# Altium footprint library Connector_art.PcbLib: 209 footprints (part 8 of 14)
Each footprint in its own frame and in the unit in brackets; x right, y up, seen from the top. Pads: shape width x height; smd on the part's side, far side on the other; paste and mask are expansions set on the pad; w line width, h text height; cw(c..) or ccw(c..) is an arc to the next point about the centre after c.
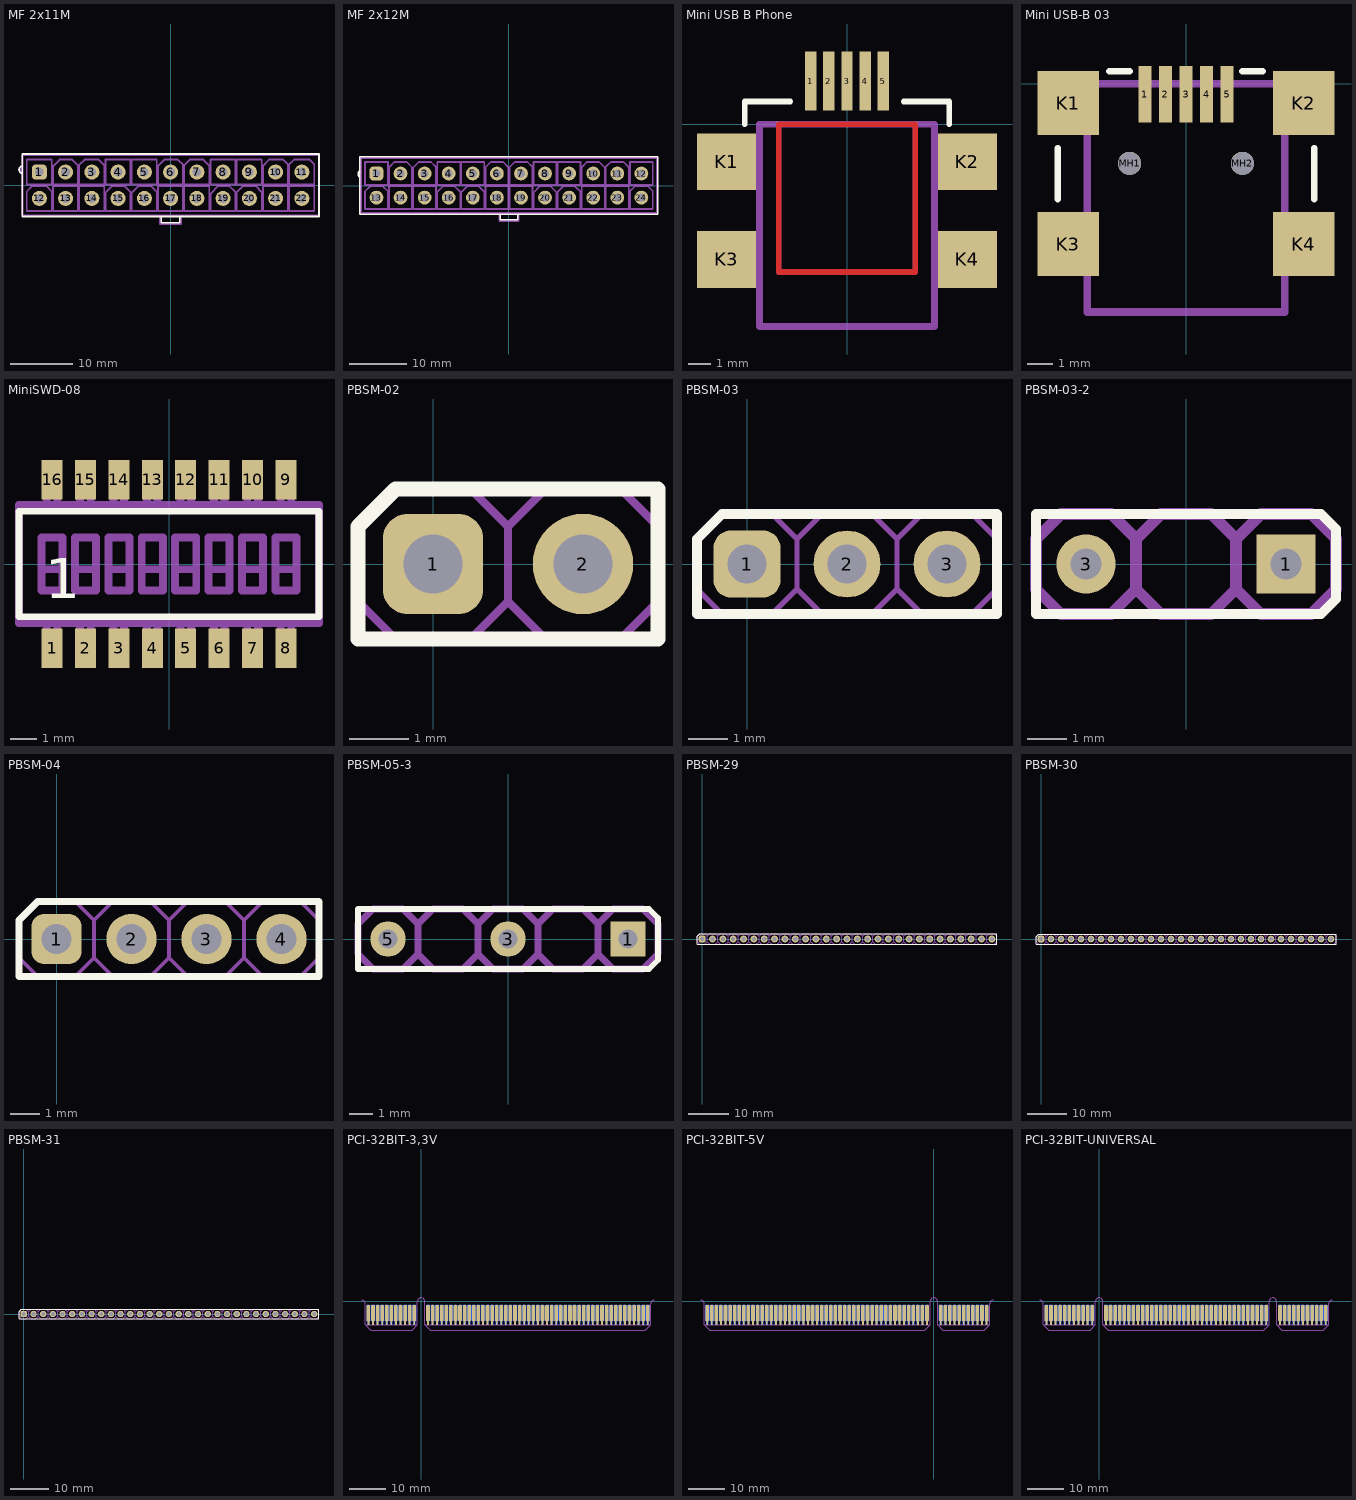
[diagram p7: the footprints below, top view; thin cyan lines are the x and y axes]

## MF 2x11M [mm]
height 12.8
pads (22):
  rrect50% 2.4x2.4 hole 1.4 paste+0: 1(-21,2.1)
  round 2.4 hole 1.4: 2(-16.8,2.1) 3(-12.6,2.1) 4(-8.4,2.1) 5(-4.2,2.1) 6(0,2.1) 7(4.2,2.1) 8(8.4,2.1) 9(12.6,2.1) 10(16.8,2.1) 11(21,2.1) 12(-21,-2.1) 13(-16.8,-2.1) 14(-12.6,-2.1) 15(-8.4,-2.1) 16(-4.2,-2.1) 17(0,-2.1) 18(4.2,-2.1) 19(8.4,-2.1) 20(12.6,-2.1) 21(16.8,-2.1) 22(21,-2.1)
Top Overlay:
  lines w0.25: -23.71,1.903 cw(c-23.65,2.5) -23.71,3.097 ; -1.5,-5 -1.5,-6 1.5,-6 1.5,-5 ; -23.75,-5 -23.75,5 23.75,5 23.75,-5 -23.75,-5
Mechanical 1:
  lines w0.3: -23.7,2.1 cw(c-23.7,2.5) -23.7,2.9 ; -1.7,-4.8 -1.7,-6.2 1.7,-6.2 1.7,-4.8 ; -23.7,-4.8 -23.7,4.8 23.7,4.8 23.7,-4.8 -23.7,-4.8 ; -23,-4.1 -23,-1 -22.1,-0.1 -19.9,-0.1 -19,-1 -19,-4.1 -23,-4.1 ; -23,0.1 -23,4.1 -19,4.1 -19,0.1 -23,0.1 ; -18.8,-4.1 -14.8,-4.1 -14.8,-0.1 -18.8,-0.1 -18.8,-4.1 ; -18.8,0.1 -14.8,0.1 -14.8,3.15 -15.75,4.1 -17.75,4.1 -18.8,3.05 -18.8,0.1 ; -14.6,-4.1 -14.6,-0.1 -10.6,-0.1 -10.6,-4.1 -14.6,-4.1 ; -14.6,0.1 -14.6,3.25 -13.75,4.1 -11.5,4.1 -10.6,3.2 -10.6,0.1 -14.6,0.1 ; -10.4,-4.1 -6.4,-4.1 -6.4,-1.1 -7.4,-0.1 -9.35,-0.1 -10.4,-1.15 -10.4,-4.1 ; -10.4,0.1 -10.4,4.1 -6.4,4.1 -6.4,0.1 -10.4,0.1 ; -6.2,-4.1 -6.2,-1.2 -5.1,-0.1 -3.15,-0.1 -2.2,-1.05 -2.2,-4.1 -6.2,-4.1 ; -6.2,0.1 -2.2,0.1 -2.2,4.1 -6.2,4.1 -6.2,0.1 ; -2,-4.1 -2,-0.1 2,-0.1 2,-4.1 -2,-4.1 ; -2,0.1 2,0.1 2,3.25 1.15,4.1 -1,4.1 -2,3.1 -2,0.1 ; 2.2,-4.1 6.2,-4.1 6.2,-0.1 2.2,-0.1 2.2,-4.1 ; 2.2,0.1 2.2,3.2 3.1,4.1 5.25,4.1 6.2,3.15 6.2,0.1 2.2,0.1 ; 6.4,-4.1 10.4,-4.1 10.4,-1.15 9.35,-0.1 7.65,-0.1 6.4,-1.35 6.4,-4.1 ; 6.4,0.1 6.4,4.1 10.4,4.1 10.4,0.1 6.4,0.1 ; 10.6,-4.1 10.6,-1.15 11.65,-0.1 13.6,-0.1 14.6,-1.1 14.6,-4.1 10.6,-4.1 ; 10.6,0.1 10.6,4.1 14.6,4.1 14.6,0.1 10.6,0.1 ; 14.8,-4.1 14.8,-0.1 18.8,-0.1 18.8,-4.1 14.8,-4.1 ; 14.8,0.1 18.8,0.1 18.8,3.3 18,4.1 15.75,4.1 14.8,3.15 14.8,0.1 ; 19,-4.1 23,-4.1 23,-0.1 19,-0.1 19,-4.1 ; 19,0.1 23,0.1 23,3.35 22.25,4.1 19.75,4.1 19,3.35 19,0.1
3D body: height 12.8, standoff -3.5, extent -24.1,-6.2 23.7,4.8

## MF 2x12M [mm]
height 12.8
pads (24):
  rrect50% 2.4x2.4 hole 1.4 paste+0: 1(-23.1,2.1)
  round 2.4 hole 1.4: 2(-18.9,2.1) 3(-14.7,2.1) 4(-10.5,2.1) 5(-6.3,2.1) 6(-2.1,2.1) 7(2.1,2.1) 8(6.3,2.1) 9(10.5,2.1) 10(14.7,2.1) 11(18.9,2.1) 12(23.1,2.1) 13(-23.1,-2.1) 14(-18.9,-2.1) 15(-14.7,-2.1) 16(-10.5,-2.1) 17(-6.3,-2.1) 18(-2.1,-2.1) 19(2.1,-2.1) 20(6.3,-2.1) 21(10.5,-2.1) 22(14.7,-2.1) 23(18.9,-2.1) 24(23.1,-2.1)
Top Overlay:
  lines w0.25: -25.926,1.428 cw(c-25.722,1.992) -25.92,2.558 ; -1.5,-5 -1.5,-6 1.5,-6 1.5,-5 ; -26,-5 -26,5 26,5 26,-5 -26,-5
Mechanical 1:
  lines w0.3: -25.8,1.6 cw(c-25.8,2) -25.8,2.4 ; -2,0.1 2,0.1 ; -1.7,-4.8 -1.7,-6.2 1.7,-6.2 1.7,-4.8 ; -25.8,-4.8 -25.8,4.8 25.8,4.8 25.8,-4.8 -25.8,-4.8 ; -25.1,-4.1 -21.1,-4.1 -21.1,-1 -22,-0.1 -24.2,-0.1 -25.1,-1 -25.1,-4.1 ; -25.1,0.1 -21.1,0.1 -21.1,4.1 -25.1,4.1 -25.1,0.1 ; -20.9,-4.1 -20.9,-0.1 -16.9,-0.1 -16.9,-4.1 -20.9,-4.1 ; -20.9,0.1 -20.9,3.2 -20,4.1 -17.85,4.1 -16.9,3.15 -16.9,0.1 -20.9,0.1 ; -16.7,-4.1 -12.7,-4.1 -12.7,-0.1 -16.7,-0.1 -16.7,-4.1 ; -16.7,0.1 -16.7,3.15 -15.75,4.1 -13.6,4.1 -12.7,3.2 -12.7,0.1 -16.7,0.1 ; -12.5,-4.1 -12.5,-1.1 -11.5,-0.1 -9.5,-0.1 -8.5,-1.1 -8.5,-4.1 -12.5,-4.1 ; -12.5,0.1 -12.5,4.1 -8.5,4.1 -8.5,0.1 -12.5,0.1 ; -8.3,-4.1 -8.3,-1.15 -7.25,-0.1 -5.25,-0.1 -4.3,-1.05 -4.3,-4.1 -8.3,-4.1 ; -8.3,0.1 -8.3,4.1 -4.3,4.1 -4.3,0.1 -8.3,0.1 ; -4.1,-4.1 -4.1,-0.1 -0.1,-0.1 -0.1,-4.1 -4.1,-4.1 ; -4.1,0.1 -4.1,3.15 -3.15,4.1 -1,4.1 -0.1,3.2 -0.1,0.1 -4.1,0.1 ; 0.1,-4.1 0.1,-0.1 4.1,-0.1 4.1,-4.1 0.1,-4.1 ; 0.1,0.1 0.1,3.2 1,4.1 3.25,4.1 4.1,3.25 4.1,0.1 0.1,0.1 ; 4.3,-4.1 4.3,-1.2 5.4,-0.1 7.25,-0.1 8.3,-1.15 8.3,-4.1 4.3,-4.1 ; 4.3,0.1 4.3,4.1 8.3,4.1 8.3,0.1 4.3,0.1 ; 8.5,-4.1 8.5,-1.1 9.5,-0.1 11.5,-0.1 12.5,-1.1 12.5,-4.1 8.5,-4.1 ; 8.5,0.1 8.5,4.1 12.5,4.1 12.5,0.1 8.5,0.1 ; 12.7,-4.1 12.7,-0.1 16.7,-0.1 16.7,-4.1 12.7,-4.1 ; 12.7,0.1 12.7,3.2 13.6,4.1 15.75,4.1 16.7,3.15 16.7,0.1 12.7,0.1 ; 16.9,-4.1 20.9,-4.1 20.9,-0.1 16.9,-0.1 16.9,-4.1 ; 16.9,0.1 16.9,3.25 17.75,4.1 20,4.1 20.9,3.2 20.9,0.1 16.9,0.1 ; 21.1,-4.1 21.1,-1 22,-0.1 24.25,-0.1 25.1,-0.95 25.1,-4.1 21.1,-4.1 ; 21.1,0.1 25.1,0.1 25.1,4.1 21.1,4.1 21.1,0.1
3D body: height 12.8, standoff -3.5, extent -26.2,-6.2 25.8,4.8

## Mini USB B Phone [mm]
height 2.6
pads (9):
  rect 0.5x2.6 smd: 1(-1.6,1.9) 2(-0.8,1.9) 3(0,1.9) 4(0.8,1.9) 5(1.6,1.9)
  rect 2.6x2.5 smd: K1(-5.3,-1.65) K2(5.3,-1.65) K3(-5.3,-5.95) K4(5.3,-5.95)
Top Layer:
  lines w0.25: -3,-6.5 -3,0 3,0 3,-6.5 -3,-6.5
Bottom Layer:
  lines w0.25: -3,-6.5 -3,0 3,0 3,-6.5 -3,-6.5
Top Overlay:
  lines w0.25: -4.5,0 -4.5,1 -2.5,1 ; 2.5,1 4.5,1 4.5,0
Top Solder:
  lines w0.8: -3.5,-7 -3.5,0.1 3.5,0.1 3.5,-7
Bottom Solder:
  lines w0.8: -3.5,-7 -3.5,0.1 3.5,0.1 3.5,-7
Mechanical 1:
  lines w0.3: -3.85,-6.7 -5.9,-6.7 -5.9,-5.2 -3.85,-5.2 ; -3.85,-2.4 -5.9,-2.4 -5.9,-0.9 -3.85,-0.9 ; 3.85,-6.7 5.9,-6.7 5.9,-5.2 3.85,-5.2 ; 3.85,-2.4 5.9,-2.4 5.9,-0.9 3.85,-0.9 ; -3.85,-8.9 -3.85,0 3.85,0 3.85,-8.9 -3.85,-8.9
3D body: height 2.6, standoff -1.3, extent -5.9,-8.9 5.9,2.5

## Mini USB-B 03 [mm]
height 3.95
pads (11):
  rect 0.5x2.2 smd: 1(-1.6,-0.4) 2(-0.8,-0.4) 3(0,-0.4) 4(0.8,-0.4) 5(1.6,-0.4)
  rect 2.4x2.5 smd: K1(-4.6,-0.75) K2(4.6,-0.75) K3(-4.6,-6.25) K4(4.6,-6.25)
  round 0.9 hole 0.9 unplated: MH1(-2.2,-3.1) MH2(2.2,-3.1)
Top Overlay:
  lines w0.25: -5,-4.5 -5,-2.5 ; -3,0.5 -2.2,0.5 ; 2.2,0.5 3,0.5 ; 5,-4.5 5,-2.5
Mechanical 1:
  lines w0.3: -3.85,-7 -5,-7 -5,-5.5 -3.85,-5.5 ; -3.85,-1.5 -5,-1.5 -5,0 -3.85,0 ; 3.85,-7 5,-7 5,-5.5 3.85,-5.5 ; 3.85,-1.5 5,-1.5 5,0 3.85,0 ; -3.85,0 3.85,0 ; -3.85,0 -3.85,-8.9 3.85,-8.9 3.85,0
3D body: height 3.95, standoff -1, extent -4.95,-9 4.95,0

## MiniSWD-08 [mm]
height 1.5
pads (16):
  rect 0.8x1.5 smd: 1(-4.445,-3.2) 2(-3.175,-3.2) 3(-1.905,-3.2) 4(-0.635,-3.2) 5(0.635,-3.2) 6(1.905,-3.2) 7(3.175,-3.2) 8(4.445,-3.2) 9(4.445,3.2) 10(3.175,3.2) 11(1.905,3.2) 12(0.635,3.2) 13(-0.635,3.2) 14(-1.905,3.2) 15(-3.175,3.2) 16(-4.445,3.2)
Top Overlay:
  lines w0.25: -5.7,-2 -5.7,2 5.7,2 5.7,-2 -5.7,-2
  text "1" at -4.7,-1.3 h1.52
Mechanical 1:
  lines w0.3: -4.845,-0.2 -4.045,-0.2 ; -4.645,-2.25 -4.645,-3.35 -4.245,-3.35 -4.245,-2.25 ; -4.645,2.25 -4.645,3.35 -4.245,3.35 -4.245,2.25 ; -3.575,-0.2 -2.775,-0.2 ; -3.375,-2.25 -3.375,-3.35 -2.975,-3.35 -2.975,-2.25 ; -3.375,2.25 -3.375,3.35 -2.975,3.35 -2.975,2.25 ; -2.305,-0.2 -1.505,-0.2 ; -2.105,-2.25 -2.105,-3.35 -1.705,-3.35 -1.705,-2.25 ; -2.105,2.25 -2.105,3.35 -1.705,3.35 -1.705,2.25 ; -1.035,-0.2 -0.235,-0.2 ; -0.835,-2.25 -0.835,-3.35 -0.435,-3.35 -0.435,-2.25 ; -0.835,2.25 -0.835,3.35 -0.435,3.35 -0.435,2.25 ; 0.235,-0.2 1.035,-0.2 ; 0.435,-2.25 0.435,-3.35 0.835,-3.35 0.835,-2.25 ; 0.435,2.25 0.435,3.35 0.835,3.35 0.835,2.25 ; 1.505,-0.2 2.305,-0.2 ; 1.705,-2.25 1.705,-3.35 2.105,-3.35 2.105,-2.25 ; 1.705,2.25 1.705,3.35 2.105,3.35 2.105,2.25 ; 2.775,-0.2 3.575,-0.2 ; 2.975,-2.25 2.975,-3.35 3.375,-3.35 3.375,-2.25 ; 2.975,2.25 2.975,3.35 3.375,3.35 3.375,2.25 ; 4.045,-0.2 4.845,-0.2 ; 4.245,-2.25 4.245,-3.35 4.645,-3.35 4.645,-2.25 ; 4.245,2.25 4.245,3.35 4.645,3.35 4.645,2.25 ; -5.7,-2.25 -5.7,2.25 5.7,2.25 5.7,-2.25 -5.7,-2.25 ; -4.845,-1 -4.045,-1 -4.045,1 -4.845,1 -4.845,-1 ; -3.575,-1 -2.775,-1 -2.775,1 -3.575,1 -3.575,-1 ; -2.305,-1 -1.505,-1 -1.505,1 -2.305,1 -2.305,-1 ; -1.035,-1 -0.235,-1 -0.235,1 -1.035,1 -1.035,-1 ; 0.235,-1 1.035,-1 1.035,1 0.235,1 0.235,-1 ; 1.505,-1 2.305,-1 2.305,1 1.505,1 1.505,-1 ; 2.775,-1 3.575,-1 3.575,1 2.775,1 2.775,-1 ; 4.045,-1 4.845,-1 4.845,1 4.045,1 4.045,-1
3D body: height 1.5, standoff 0, extent -5.7,-3.35 5.7,3.35

## PBSM-02 [mm]
pads (2):
  rrect50% 1.7x1.7 hole 1: 1(0,0)
  round 1.7 hole 1: 2(2.54,0)
Top Overlay:
  lines w0.25: -1.27,-1.27 -0.635,-1.27 3.81,-1.27 3.81,1.27 -0.635,1.27 -1.27,0.635 -1.27,-1.27
Mechanical 1:
  lines w0.13: 1.27,-0.635 1.905,-1.27 3.175,-1.27 3.81,-0.635 3.81,0.635 3.175,1.27 1.905,1.27 1.27,0.635 ; 1.27,-0.635 0.635,-1.27 -0.635,-1.27 -1.27,-0.635 -1.27,0.635 -0.635,1.27 0.635,1.27 1.27,0.635 ; 1.27,-0.635 1.27,0.635
3D body: height 4.45, standoff -2.95, extent -1.27,-1.27 3.81,1.27

## PBSM-03 [mm]
pads (3):
  rrect50% 1.7x1.7 hole 1: 1(0,0)
  round 1.7 hole 1: 2(2.54,0) 3(5.08,0)
Top Overlay:
  lines w0.25: -1.27,-1.27 -0.635,-1.27 6.35,-1.27 6.35,1.27 -0.635,1.27 -1.27,0.635 -1.27,-1.27
Mechanical 1:
  lines w0.13: 1.27,-0.635 1.905,-1.27 3.175,-1.27 3.81,-0.635 ; 1.27,-0.635 0.635,-1.27 -0.635,-1.27 -1.27,-0.635 -1.27,0.635 -0.635,1.27 0.635,1.27 1.27,0.635 ; 1.27,-0.635 1.27,0.635 ; 1.27,0.635 1.905,1.27 3.175,1.27 3.81,0.635 ; 3.81,-0.635 4.445,-1.27 5.715,-1.27 6.35,-0.635 6.35,0.635 5.715,1.27 4.445,1.27 3.81,0.635 ; 3.81,-0.635 3.81,0.635
3D body: height 4.45, standoff -2.95, extent -1.27,-1.27 6.35,1.27

## PBSM-03-2 [mm]
height 4.45
pads (2):
  rect 1.5x1.5 hole 0.8 paste+0: 1(2.54,0)
  round 1.5 hole 0.8: 3(-2.54,0)
Top Overlay:
  lines w0.25: -3.81,-1.27 -3.81,1.27 3.429,1.27 3.81,0.889 3.81,-0.889 3.429,-1.27 -3.81,-1.27
Mechanical 1:
  lines w0.3: -1.27,-0.635 -1.905,-1.27 -3.175,-1.27 -3.81,-0.635 -3.81,0.635 -3.175,1.27 -1.905,1.27 -1.27,0.635 ; -1.27,-0.635 -1.27,0.635 ; -1.27,-0.635 -0.635,-1.27 0.635,-1.27 1.27,-0.635 ; -1.27,0.635 -0.635,1.27 0.635,1.27 1.27,0.635 ; 1.27,-0.635 1.905,-1.27 3.175,-1.27 3.81,-0.635 3.81,0.635 3.175,1.27 1.905,1.27 1.27,0.635 ; 1.27,-0.635 1.27,0.635
3D body: height 4.45, standoff -2.95, extent -3.81,-1.27 3.81,1.27

## PBSM-04 [mm]
pads (4):
  rrect50% 1.7x1.7 hole 1: 1(0,0)
  round 1.7 hole 1: 2(2.54,0) 3(5.08,0) 4(7.62,0)
Top Overlay:
  lines w0.25: -1.27,-1.27 -0.635,-1.27 8.89,-1.27 8.89,1.27 -0.635,1.27 -1.27,0.635 -1.27,-1.27
Mechanical 1:
  lines w0.13: 1.27,-0.635 1.905,-1.27 3.175,-1.27 3.81,-0.635 ; 1.27,-0.635 0.635,-1.27 -0.635,-1.27 -1.27,-0.635 -1.27,0.635 -0.635,1.27 0.635,1.27 1.27,0.635 ; 1.27,-0.635 1.27,0.635 ; 1.27,0.635 1.905,1.27 3.175,1.27 3.81,0.635 ; 3.81,-0.635 4.445,-1.27 5.715,-1.27 6.35,-0.635 ; 3.81,-0.635 3.81,0.635 ; 3.81,0.635 4.445,1.27 5.715,1.27 6.35,0.635 ; 6.35,-0.635 6.35,0.635 ; 6.35,-0.635 6.985,-1.27 8.255,-1.27 8.89,-0.635 8.89,0.635 8.255,1.27 6.985,1.27 6.35,0.635
3D body: height 4.45, standoff -2.95, extent -1.27,-1.27 8.89,1.27

## PBSM-05-3 [mm]
height 4.45
pads (3):
  rect 1.5x1.5 hole 0.8 paste+0: 1(5.08,0)
  round 1.5 hole 0.8: 3(0,0) 5(-5.08,0)
Top Overlay:
  lines w0.25: -6.35,-1.27 5.969,-1.27 6.35,-0.889 6.35,0.889 5.969,1.27 -6.35,1.27 -6.35,-1.27
Mechanical 1:
  lines w0.3: -3.81,-0.635 -4.445,-1.27 -5.715,-1.27 -6.35,-0.635 -6.35,0.635 -5.715,1.27 -4.445,1.27 -3.81,0.635 ; -3.81,-0.635 -3.81,0.635 ; -3.81,-0.635 -3.175,-1.27 -1.905,-1.27 -1.27,-0.635 ; -3.81,0.635 -3.175,1.27 -1.905,1.27 -1.27,0.635 ; -1.27,-0.635 -0.635,-1.27 0.635,-1.27 1.27,-0.635 ; -1.27,-0.635 -1.27,0.635 ; -1.27,0.635 -0.635,1.27 0.635,1.27 1.27,0.635 ; 1.27,-0.635 1.905,-1.27 3.175,-1.27 3.81,-0.635 ; 1.27,-0.635 1.27,0.635 ; 1.27,0.635 1.905,1.27 3.175,1.27 3.81,0.635 ; 3.81,-0.635 3.81,0.635 ; 3.81,-0.635 4.445,-1.27 5.715,-1.27 6.35,-0.635 6.35,0.635 5.715,1.27 4.445,1.27 3.81,0.635
3D body: height 4.45, standoff -2.95, extent -6.35,-1.27 6.35,1.27

## PBSM-29 [mm]
pads (29):
  rrect50% 1.7x1.7 hole 1: 1(0,0)
  round 1.7 hole 1: 2(2.54,0) 3(5.08,0) 4(7.62,0) 5(10.16,0) 6(12.7,0) 7(15.24,0) 8(17.78,0) 9(20.32,0) 10(22.86,0) 11(25.4,0) 12(27.94,0) 13(30.48,0) 14(33.02,0) 15(35.56,0) 16(38.1,0) 17(40.64,0) 18(43.18,0) 19(45.72,0) 20(48.26,0) 21(50.8,0) 22(53.34,0) 23(55.88,0) 24(58.42,0) 25(60.96,0) 26(63.5,0) 27(66.04,0) 28(68.58,0) 29(71.12,0)
Top Overlay:
  lines w0.25: -1.27,-1.27 -0.635,-1.27 72.39,-1.27 72.39,1.27 -0.635,1.27 -1.27,0.635 -1.27,-1.27
Mechanical 1:
  drawing of 204 lines, arcs and shapes, not listed
3D body: height 4.45, standoff -2.95, extent -1.27,-1.27 72.39,1.27

## PBSM-30 [mm]
pads (30):
  rrect50% 1.7x1.7 hole 1: 1(0,0)
  round 1.7 hole 1: 2(2.54,0) 3(5.08,0) 4(7.62,0) 5(10.16,0) 6(12.7,0) 7(15.24,0) 8(17.78,0) 9(20.32,0) 10(22.86,0) 11(25.4,0) 12(27.94,0) 13(30.48,0) 14(33.02,0) 15(35.56,0) 16(38.1,0) 17(40.64,0) 18(43.18,0) 19(45.72,0) 20(48.26,0) 21(50.8,0) 22(53.34,0) 23(55.88,0) 24(58.42,0) 25(60.96,0) 26(63.5,0) 27(66.04,0) 28(68.58,0) 29(71.12,0) 30(73.66,0)
Top Overlay:
  lines w0.25: -1.27,-1.27 -1.27,0.635 -0.635,1.27 74.93,1.27 74.93,-1.27 -0.635,-1.27 -1.27,-1.27
Mechanical 1:
  drawing of 211 lines, arcs and shapes, not listed
3D body: height 4.45, standoff -2.95, extent -1.27,-1.27 74.93,1.27

## PBSM-31 [mm]
pads (31):
  rrect50% 1.7x1.7 hole 1: 1(0,0)
  round 1.7 hole 1: 2(2.54,0) 3(5.08,0) 4(7.62,0) 5(10.16,0) 6(12.7,0) 7(15.24,0) 8(17.78,0) 9(20.32,0) 10(22.86,0) 11(25.4,0) 12(27.94,0) 13(30.48,0) 14(33.02,0) 15(35.56,0) 16(38.1,0) 17(40.64,0) 18(43.18,0) 19(45.72,0) 20(48.26,0) 21(50.8,0) 22(53.34,0) 23(55.88,0) 24(58.42,0) 25(60.96,0) 26(63.5,0) 27(66.04,0) 28(68.58,0) 29(71.12,0) 30(73.66,0) 31(76.2,0)
Top Overlay:
  lines w0.25: -1.27,-1.27 -0.635,-1.27 77.47,-1.27 77.47,1.27 -0.635,1.27 -1.27,0.635 -1.27,-1.27
Mechanical 1:
  drawing of 218 lines, arcs and shapes, not listed
3D body: height 4.45, standoff -2.95, extent -1.27,-1.27 77.47,1.27

## PCI-32BIT-3,3V [mm]
pads (240):
  rect 0.5x1 smd far side: A1(-14.61,-6) A2(-13.34,-6) A3(-12.07,-6) A4(-10.8,-6) A5(-9.53,-6) A6(-8.26,-6) A7(-6.99,-6) A8(-5.72,-6) A9(-4.45,-6) A10(-3.18,-6) A11(-1.91,-6) A14(1.91,-6) A15(3.18,-6) A16(4.45,-6) A17(5.72,-6) A18(6.99,-6) A19(8.26,-6) A20(9.53,-6) A21(10.8,-6) A22(12.07,-6) A23(13.34,-6) A24(14.61,-6) A25(15.88,-6) A26(17.15,-6) A27(18.42,-6) A28(19.69,-6) A29(20.96,-6) A30(22.23,-6) A31(23.5,-6) A32(24.77,-6) A33(26.04,-6) A34(27.31,-6) A35(28.58,-6) A36(29.85,-6) A37(31.12,-6) A38(32.39,-6) A39(33.66,-6) A40(34.93,-6) A41(36.2,-6) A42(37.47,-6) A43(38.74,-6) A44(40.01,-6) A45(41.28,-6) A46(42.55,-6) A47(43.82,-6) A48(45.09,-6) A49(46.36,-6) A50(47.63,-6) A51(48.9,-6) A52(50.17,-6) A53(51.44,-6) A54(52.71,-6) A55(53.98,-6) A56(55.25,-6) A57(56.52,-6) A58(57.79,-6) A59(59.06,-6) A60(60.33,-6) A61(61.6,-6) A62(62.87,-6)
  rrect50% 1x4.5 smd far side: A1(-14.61,-3.25) A2(-13.34,-3.25) A3(-12.07,-3.25) A4(-10.8,-3.25) A5(-9.53,-3.25) A6(-8.26,-3.25) A7(-6.99,-3.25) A8(-5.72,-3.25) A9(-4.45,-3.25) A10(-3.18,-3.25) A11(-1.91,-3.25) A14(1.91,-3.25) A15(3.18,-3.25) A16(4.45,-3.25) A17(5.72,-3.25) A18(6.99,-3.25) A19(8.26,-3.25) A20(9.53,-3.25) A21(10.8,-3.25) A22(12.07,-3.25) A23(13.34,-3.25) A24(14.61,-3.25) A25(15.88,-3.25) A26(17.15,-3.25) A27(18.42,-3.25) A28(19.69,-3.25) A29(20.96,-3.25) A30(22.23,-3.25) A31(23.5,-3.25) A32(24.77,-3.25) A33(26.04,-3.25) A34(27.31,-3.25) A35(28.58,-3.25) A36(29.85,-3.25) A37(31.12,-3.25) A38(32.39,-3.25) A39(33.66,-3.25) A40(34.93,-3.25) A41(36.2,-3.25) A42(37.47,-3.25) A43(38.74,-3.25) A44(40.01,-3.25) A45(41.28,-3.25) A46(42.55,-3.25) A47(43.82,-3.25) A48(45.09,-3.25) A49(46.36,-3.25) A50(47.63,-3.25) A51(48.9,-3.25) A52(50.17,-3.25) A53(51.44,-3.25) A54(52.71,-3.25) A55(53.98,-3.25) A56(55.25,-3.25) A57(56.52,-3.25) A58(57.79,-3.25) A59(59.06,-3.25) A60(60.33,-3.25) A61(61.6,-3.25) A62(62.87,-3.25)
  rect 0.5x1 smd: B1(-14.61,-6) B2(-13.34,-6) B3(-12.07,-6) B4(-10.8,-6) B5(-9.53,-6) B6(-8.26,-6) B7(-6.99,-6) B8(-5.72,-6) B9(-4.45,-6) B10(-3.18,-6) B11(-1.91,-6) B14(1.91,-6) B15(3.18,-6) B16(4.45,-6) B17(5.72,-6) B18(6.99,-6) B19(8.26,-6) B20(9.53,-6) B21(10.8,-6) B22(12.07,-6) B23(13.34,-6) B24(14.61,-6) B25(15.88,-6) B26(17.15,-6) B27(18.42,-6) B28(19.69,-6) B29(20.96,-6) B30(22.23,-6) B31(23.5,-6) B32(24.77,-6) B33(26.04,-6) B34(27.31,-6) B35(28.58,-6) B36(29.85,-6) B37(31.12,-6) B38(32.39,-6) B39(33.66,-6) B40(34.93,-6) B41(36.2,-6) B42(37.47,-6) B43(38.74,-6) B44(40.01,-6) B45(41.28,-6) B46(42.55,-6) B47(43.82,-6) B48(45.09,-6) B49(46.36,-6) B50(47.63,-6) B51(48.9,-6) B52(50.17,-6) B53(51.44,-6) B54(52.71,-6) B55(53.98,-6) B56(55.25,-6) B57(56.52,-6) B58(57.79,-6) B59(59.06,-6) B60(60.33,-6) B61(61.6,-6) B62(62.87,-6)
  rrect50% 1x4.5 smd: B1(-14.61,-3.25) B2(-13.34,-3.25) B3(-12.07,-3.25) B4(-10.8,-3.25) B5(-9.53,-3.25) B6(-8.26,-3.25) B7(-6.99,-3.25) B8(-5.72,-3.25) B9(-4.45,-3.25) B10(-3.18,-3.25) B11(-1.91,-3.25) B14(1.91,-3.25) B15(3.18,-3.25) B16(4.45,-3.25) B17(5.72,-3.25) B18(6.99,-3.25) B19(8.26,-3.25) B20(9.53,-3.25) B21(10.8,-3.25) B22(12.07,-3.25) B23(13.34,-3.25) B24(14.61,-3.25) B25(15.88,-3.25) B26(17.15,-3.25) B27(18.42,-3.25) B28(19.69,-3.25) B29(20.96,-3.25) B30(22.23,-3.25) B31(23.5,-3.25) B32(24.77,-3.25) B33(26.04,-3.25) B34(27.31,-3.25) B35(28.58,-3.25) B36(29.85,-3.25) B37(31.12,-3.25) B38(32.39,-3.25) B39(33.66,-3.25) B40(34.93,-3.25) B41(36.2,-3.25) B42(37.47,-3.25) B43(38.74,-3.25) B44(40.01,-3.25) B45(41.28,-3.25) B46(42.55,-3.25) B47(43.82,-3.25) B48(45.09,-3.25) B49(46.36,-3.25) B50(47.63,-3.25) B51(48.9,-3.25) B52(50.17,-3.25) B53(51.44,-3.25) B54(52.71,-3.25) B55(53.98,-3.25) B56(55.25,-3.25) B57(56.52,-3.25) B58(57.79,-3.25) B59(59.06,-3.25) B60(60.33,-3.25) B61(61.6,-3.25) B62(62.87,-3.25)
Top Solder:
  region: 1,-0.7 63.7,-0.7 63.7,-6.5 62.2,-8 2.5,-8 1,-6.5
  region: -15.5,-0.7 -15.5,-6.5 -14,-8 -2.5,-8 -1,-6.5 -1,-0.7
Bottom Solder:
  region: 1,-0.7 63.7,-0.7 63.7,-6.5 62.2,-8 2.5,-8 1,-6.5
  region: -15.5,-0.7 -15.5,-6.5 -14,-8 -2.5,-8 -1,-6.5 -1,-0.7
Mechanical 1:
  lines w0.25: -16.5,0.3 cw(c-16.5,-0.7) -15.5,-0.7 -15.5,-6.5 ; 64.7,0.3 ccw(c64.7,-0.7) 63.7,-0.7 63.7,-6.5 ; -15.5,-6.5 -1,-6.5 ; -15.5,-6.5 -14,-8 -2.5,-8 -1,-6.5 ; -1,-6.5 -1,0 cw(c0,0) 1,0 1,-6.5 ; 1,-6.5 2.5,-8 62.2,-8 63.7,-6.5 ; 1,-6.5 63.7,-6.5
  text "B62" at 63.4,0 h1.5
  text "B14" at 2.4,0 h1.5
  text "B11" at -1.4,0 h1.5
  text "B1" at -14.1,0 h1.5
Mechanical 2:
  lines w0.25: -16.5,0.3 cw(c-16.5,-0.7) -15.5,-0.7 -15.5,-6.5 ; 64.7,0.3 ccw(c64.7,-0.7) 63.7,-0.7 63.7,-6.5 ; -15.5,-6.5 -14,-8 -2.5,-8 -1,-6.5 ; -15.5,-6.5 -1,-6.5 ; -1,-6.5 -1,0 cw(c0,0) 1,0 1,-6.5 ; 1,-6.5 63.7,-6.5 ; 1,-6.5 2.5,-8 62.2,-8 63.7,-6.5
  text "A62" at 62.4,0 h1.5
  text "A14" at 1.4,0 h1.5
  text "A11" at -2.4,0 h1.5
  text "A1" at -15.1,0 h1.5

## PCI-32BIT-5V [mm]
pads (240):
  rect 0.5x1 smd far side: A1(-62.87,-6) A2(-61.6,-6) A3(-60.33,-6) A4(-59.06,-6) A5(-57.79,-6) A6(-56.52,-6) A7(-55.25,-6) A8(-53.98,-6) A9(-52.71,-6) A10(-51.44,-6) A11(-50.17,-6) A12(-48.9,-6) A13(-47.63,-6) A14(-46.36,-6) A15(-45.09,-6) A16(-43.82,-6) A17(-42.55,-6) A18(-41.28,-6) A19(-40.01,-6) A20(-38.74,-6) A21(-37.47,-6) A22(-36.2,-6) A23(-34.93,-6) A24(-33.66,-6) A25(-32.39,-6) A26(-31.12,-6) A27(-29.85,-6) A28(-28.58,-6) A29(-27.31,-6) A30(-26.04,-6) A31(-24.77,-6) A32(-23.5,-6) A33(-22.23,-6) A34(-20.96,-6) A35(-19.69,-6) A36(-18.42,-6) A37(-17.15,-6) A38(-15.88,-6) A39(-14.61,-6) A40(-13.34,-6) A41(-12.07,-6) A42(-10.8,-6) A43(-9.53,-6) A44(-8.26,-6) A45(-6.99,-6) A46(-5.72,-6) A47(-4.45,-6) A48(-3.18,-6) A49(-1.91,-6) A52(1.91,-6) A53(3.18,-6) A54(4.45,-6) A55(5.72,-6) A56(6.99,-6) A57(8.26,-6) A58(9.53,-6) A59(10.8,-6) A60(12.07,-6) A61(13.34,-6) A62(14.61,-6)
  rrect50% 1x4.5 smd far side: A1(-62.87,-3.25) A2(-61.6,-3.25) A3(-60.33,-3.25) A4(-59.06,-3.25) A5(-57.79,-3.25) A6(-56.52,-3.25) A7(-55.25,-3.25) A8(-53.98,-3.25) A9(-52.71,-3.25) A10(-51.44,-3.25) A11(-50.17,-3.25) A12(-48.9,-3.25) A13(-47.63,-3.25) A14(-46.36,-3.25) A15(-45.09,-3.25) A16(-43.82,-3.25) A17(-42.55,-3.25) A18(-41.28,-3.25) A19(-40.01,-3.25) A20(-38.74,-3.25) A21(-37.47,-3.25) A22(-36.2,-3.25) A23(-34.93,-3.25) A24(-33.66,-3.25) A25(-32.39,-3.25) A26(-31.12,-3.25) A27(-29.85,-3.25) A28(-28.58,-3.25) A29(-27.31,-3.25) A30(-26.04,-3.25) A31(-24.77,-3.25) A32(-23.5,-3.25) A33(-22.23,-3.25) A34(-20.96,-3.25) A35(-19.69,-3.25) A36(-18.42,-3.25) A37(-17.15,-3.25) A38(-15.88,-3.25) A39(-14.61,-3.25) A40(-13.34,-3.25) A41(-12.07,-3.25) A42(-10.8,-3.25) A43(-9.53,-3.25) A44(-8.26,-3.25) A45(-6.99,-3.25) A46(-5.72,-3.25) A47(-4.45,-3.25) A48(-3.18,-3.25) A49(-1.91,-3.25) A52(1.91,-3.25) A53(3.18,-3.25) A54(4.45,-3.25) A55(5.72,-3.25) A56(6.99,-3.25) A57(8.26,-3.25) A58(9.53,-3.25) A59(10.8,-3.25) A60(12.07,-3.25) A61(13.34,-3.25) A62(14.61,-3.25)
  rect 0.5x1 smd: B1(-62.87,-6) B2(-61.6,-6) B3(-60.33,-6) B4(-59.06,-6) B5(-57.79,-6) B6(-56.52,-6) B7(-55.25,-6) B8(-53.98,-6) B9(-52.71,-6) B10(-51.44,-6) B11(-50.17,-6) B12(-48.9,-6) B13(-47.63,-6) B14(-46.36,-6) B15(-45.09,-6) B16(-43.82,-6) B17(-42.55,-6) B18(-41.28,-6) B19(-40.01,-6) B20(-38.74,-6) B21(-37.47,-6) B22(-36.2,-6) B23(-34.93,-6) B24(-33.66,-6) B25(-32.39,-6) B26(-31.12,-6) B26(-29.85,-6) B28(-28.58,-6) B29(-27.31,-6) B30(-26.04,-6) B31(-24.77,-6) B32(-23.5,-6) B33(-22.23,-6) B34(-20.96,-6) B35(-19.69,-6) B36(-18.42,-6) B37(-17.15,-6) B38(-15.88,-6) B39(-14.61,-6) B40(-13.34,-6) B41(-12.07,-6) B42(-10.8,-6) B43(-9.53,-6) B44(-8.26,-6) B45(-6.99,-6) B46(-5.72,-6) B47(-4.45,-6) B48(-3.18,-6) B49(-1.91,-6) B52(1.91,-6) B53(3.18,-6) B54(4.45,-6) B55(5.72,-6) B56(6.99,-6) B57(8.26,-6) B58(9.53,-6) B59(10.8,-6) B60(12.07,-6) B61(13.34,-6) B62(14.61,-6)
  rrect50% 1x4.5 smd: B1(-62.87,-3.25) B2(-61.6,-3.25) B3(-60.33,-3.25) B4(-59.06,-3.25) B5(-57.79,-3.25) B6(-56.52,-3.25) B7(-55.25,-3.25) B8(-53.98,-3.25) B9(-52.71,-3.25) B10(-51.44,-3.25) B11(-50.17,-3.25) B12(-48.9,-3.25) B13(-47.63,-3.25) B14(-46.36,-3.25) B15(-45.09,-3.25) B16(-43.82,-3.25) B17(-42.55,-3.25) B18(-41.28,-3.25) B19(-40.01,-3.25) B20(-38.74,-3.25) B21(-37.47,-3.25) B22(-36.2,-3.25) B23(-34.93,-3.25) B24(-33.66,-3.25) B25(-32.39,-3.25) B26(-31.12,-3.25) B26(-29.85,-3.25) B28(-28.58,-3.25) B29(-27.31,-3.25) B30(-26.04,-3.25) B31(-24.77,-3.25) B32(-23.5,-3.25) B33(-22.23,-3.25) B34(-20.96,-3.25) B35(-19.69,-3.25) B36(-18.42,-3.25) B37(-17.15,-3.25) B38(-15.88,-3.25) B39(-14.61,-3.25) B40(-13.34,-3.25) B41(-12.07,-3.25) B42(-10.8,-3.25) B43(-9.53,-3.25) B44(-8.26,-3.25) B45(-6.99,-3.25) B46(-5.72,-3.25) B47(-4.45,-3.25) B48(-3.18,-3.25) B49(-1.91,-3.25) B52(1.91,-3.25) B53(3.18,-3.25) B54(4.45,-3.25) B55(5.72,-3.25) B56(6.99,-3.25) B57(8.26,-3.25) B58(9.53,-3.25) B59(10.8,-3.25) B60(12.07,-3.25) B61(13.34,-3.25) B62(14.61,-3.25)
Top Solder:
  region: -63.7,-0.7 -1,-0.7 -1,-6.5 -2.5,-8 -62.2,-8 -63.7,-6.5
  region: 1,-0.7 1,-6.5 2.5,-8 14,-8 15.5,-6.5 15.5,-0.7
Bottom Solder:
  region: 1,-0.7 1,-6.5 2.5,-8 14,-8 15.5,-6.5 15.5,-0.7
  region: -63.7,-0.7 -1,-0.7 -1,-6.5 -2.5,-8 -62.2,-8 -63.7,-6.5
Mechanical 1:
  lines w0.25: -64.7,0.3 cw(c-64.7,-0.7) -63.7,-0.7 -63.7,-6.5 ; 16.5,0.3 ccw(c16.5,-0.7) 15.5,-0.7 15.5,-6.5 ; -63.7,-6.5 -1,-6.5 ; -63.7,-6.5 -62.2,-8 -2.5,-8 -1,-6.5 ; -1,-6.5 -1,0 cw(c0,0) 1,0 1,-6.5 ; 1,-6.5 15.5,-6.5 ; 1,-6.5 2.5,-8 14,-8 15.5,-6.5
  text "B1" at -62.4,0 h1.5
  text "B49" at -1.4,0 h1.5
  text "B52" at 2.4,0 h1.5
  text "B62" at 15.1,0 h1.5
Mechanical 2:
  lines w0.25: -64.7,0.3 cw(c-64.7,-0.7) -63.7,-0.7 -63.7,-6.5 ; 16.5,0.3 ccw(c16.5,-0.7) 15.5,-0.7 15.5,-6.5 ; -63.7,-6.5 -62.2,-8 -2.5,-8 -1,-6.5 ; -63.7,-6.5 -1,-6.5 ; -1,-6.5 -1,0 cw(c0,0) 1,0 1,-6.5 ; 1,-6.5 2.5,-8 14,-8 15.5,-6.5 ; 1,-6.5 15.5,-6.5
  text "A1" at -63.4,0 h1.5
  text "A49" at -2.4,0 h1.5
  text "A52" at 1.4,0 h1.5
  text "A62" at 14.1,0 h1.5

## PCI-32BIT-UNIVERSAL [mm]
pads (232):
  rect 0.5x1 smd far side: A1(-14.61,-6) A2(-13.34,-6) A3(-12.07,-6) A4(-10.8,-6) A5(-9.53,-6) A6(-8.26,-6) A7(-6.99,-6) A8(-5.72,-6) A9(-4.45,-6) A10(-3.18,-6) A11(-1.91,-6) A14(1.9,-6) A15(3.17,-6) A16(4.44,-6) A17(5.71,-6) A18(6.98,-6) A19(8.25,-6) A20(9.52,-6) A21(10.79,-6) A22(12.06,-6) A23(13.33,-6) A24(14.6,-6) A25(15.87,-6) A26(17.14,-6) A27(18.41,-6) A28(19.68,-6) A29(20.95,-6) A30(22.22,-6) A31(23.49,-6) A32(24.76,-6) A33(26.03,-6) A34(27.3,-6) A35(28.57,-6) A36(29.84,-6) A37(31.11,-6) A38(32.38,-6) A39(33.65,-6) A40(34.92,-6) A41(36.19,-6) A42(37.46,-6) A43(38.73,-6) A44(40,-6) A45(41.27,-6) A46(42.54,-6) A47(43.81,-6) A48(45.08,-6) A49(46.35,-6) A52(50.17,-6) A53(51.44,-6) A54(52.71,-6) A55(53.98,-6) A56(55.25,-6) A57(56.52,-6) A58(57.79,-6) A59(59.06,-6) A60(60.33,-6) A61(61.6,-6) A62(62.87,-6)
  rrect50% 1x4.5 smd far side: A1(-14.61,-3.25) A2(-13.34,-3.25) A3(-12.07,-3.25) A4(-10.8,-3.25) A5(-9.53,-3.25) A6(-8.26,-3.25) A7(-6.99,-3.25) A8(-5.72,-3.25) A9(-4.45,-3.25) A10(-3.18,-3.25) A11(-1.91,-3.25) A14(1.9,-3.25) A15(3.17,-3.25) A16(4.44,-3.25) A17(5.71,-3.25) A18(6.98,-3.25) A19(8.25,-3.25) A20(9.52,-3.25) A21(10.79,-3.25) A22(12.06,-3.25) A23(13.33,-3.25) A24(14.6,-3.25) A25(15.87,-3.25) A26(17.14,-3.25) A27(18.41,-3.25) A28(19.68,-3.25) A29(20.95,-3.25) A30(22.22,-3.25) A31(23.49,-3.25) A32(24.76,-3.25) A33(26.03,-3.25) A34(27.3,-3.25) A35(28.57,-3.25) A36(29.84,-3.25) A37(31.11,-3.25) A38(32.38,-3.25) A39(33.65,-3.25) A40(34.92,-3.25) A41(36.19,-3.25) A42(37.46,-3.25) A43(38.73,-3.25) A44(40,-3.25) A45(41.27,-3.25) A46(42.54,-3.25) A47(43.81,-3.25) A48(45.08,-3.25) A49(46.35,-3.25) A52(50.17,-3.25) A53(51.44,-3.25) A54(52.71,-3.25) A55(53.98,-3.25) A56(55.25,-3.25) A57(56.52,-3.25) A58(57.79,-3.25) A59(59.06,-3.25) A60(60.33,-3.25) A61(61.6,-3.25) A62(62.87,-3.25)
  rect 0.5x1 smd: B1(-14.61,-6) B2(-13.34,-6) B3(-12.07,-6) B4(-10.8,-6) B5(-9.53,-6) B6(-8.26,-6) B7(-6.99,-6) B8(-5.72,-6) B9(-4.45,-6) B10(-3.18,-6) B11(-1.91,-6) B14(1.9,-6) B15(3.17,-6) B16(4.44,-6) B17(5.71,-6) B18(6.98,-6) B19(8.25,-6) B20(9.52,-6) B21(10.79,-6) B22(12.06,-6) B23(13.33,-6) B24(14.6,-6) B25(15.87,-6) B26(17.14,-6) B27(18.41,-6) B28(19.68,-6) B29(20.95,-6) B30(22.22,-6) B31(23.49,-6) B32(24.76,-6) B33(26.03,-6) B34(27.3,-6) B35(28.57,-6) B36(29.84,-6) B37(31.11,-6) B38(32.38,-6) B39(33.65,-6) B40(34.92,-6) B41(36.19,-6) B42(37.46,-6) B43(38.73,-6) B44(40,-6) B45(41.27,-6) B46(42.54,-6) B47(43.81,-6) B48(45.08,-6) B49(46.35,-6) B52(50.17,-6) B53(51.44,-6) B54(52.71,-6) B55(53.98,-6) B56(55.25,-6) B57(56.52,-6) B58(57.79,-6) B59(59.06,-6) B60(60.33,-6) B61(61.6,-6) B62(62.87,-6)
  rrect50% 1x4.5 smd: B1(-14.61,-3.25) B2(-13.34,-3.25) B3(-12.07,-3.25) B4(-10.8,-3.25) B5(-9.53,-3.25) B6(-8.26,-3.25) B7(-6.99,-3.25) B8(-5.72,-3.25) B9(-4.45,-3.25) B10(-3.18,-3.25) B11(-1.91,-3.25) B14(1.9,-3.25) B15(3.17,-3.25) B16(4.44,-3.25) B17(5.71,-3.25) B18(6.98,-3.25) B19(8.25,-3.25) B20(9.52,-3.25) B21(10.79,-3.25) B22(12.06,-3.25) B23(13.33,-3.25) B24(14.6,-3.25) B25(15.87,-3.25) B26(17.14,-3.25) B27(18.41,-3.25) B28(19.68,-3.25) B29(20.95,-3.25) B30(22.22,-3.25) B31(23.49,-3.25) B32(24.76,-3.25) B33(26.03,-3.25) B34(27.3,-3.25) B35(28.57,-3.25) B36(29.84,-3.25) B37(31.11,-3.25) B38(32.38,-3.25) B39(33.65,-3.25) B40(34.92,-3.25) B41(36.19,-3.25) B42(37.46,-3.25) B43(38.73,-3.25) B44(40,-3.25) B45(41.27,-3.25) B46(42.54,-3.25) B47(43.81,-3.25) B48(45.08,-3.25) B49(46.35,-3.25) B52(50.17,-3.25) B53(51.44,-3.25) B54(52.71,-3.25) B55(53.98,-3.25) B56(55.25,-3.25) B57(56.52,-3.25) B58(57.79,-3.25) B59(59.06,-3.25) B60(60.33,-3.25) B61(61.6,-3.25) B62(62.87,-3.25)
Top Solder:
  region: 49.2,-0.7 49.2,-6.5 50.7,-8 62.2,-8 63.7,-6.5 63.7,-0.7
  region: 1,-0.7 1,-6.5 2.5,-8 45.7,-8 47.2,-6.5 47.2,-0.7
  region: -15.5,-0.7 -15.5,-6.5 -14,-8 -2.5,-8 -1,-6.5 -1,-0.7
Bottom Solder:
  region: 1,-0.7 1,-6.5 2.5,-8 45.7,-8 47.2,-6.5 47.2,-0.7
  region: 49.2,-0.7 49.2,-6.5 50.7,-8 62.2,-8 63.7,-6.5 63.7,-0.7
  region: -15.5,-0.7 -15.5,-6.5 -14,-8 -2.5,-8 -1,-6.5 -1,-0.7
Mechanical 1:
  lines w0.25: -16.5,0.3 cw(c-16.5,-0.7) -15.5,-0.7 -15.5,-6.5 ; 64.7,0.3 ccw(c64.7,-0.7) 63.7,-0.7 63.7,-6.5 ; -15.5,-6.5 -14,-8 -2.5,-8 -1,-6.5 ; -15.5,-6.5 -1,-6.5 ; -1,-6.5 -1,0 cw(c0,0) 1,0 1,-6.5 ; 1,-6.5 47.2,-6.5 ; 1,-6.5 2.5,-8 45.7,-8 47.2,-6.5 ; 47.2,-6.5 47.2,0 cw(c48.2,0) 49.2,0 49.2,-6.5 ; 49.2,-6.5 63.7,-6.5 ; 49.2,-6.5 50.7,-8 62.2,-8 63.7,-6.5
  text "B52" at 50.6,0 h1.5
  text "B49" at 46.8,0 h1.5
  text "B14" at 2.4,0 h1.5
  text "B11" at -1.4,0 h1.5
  text "B1" at -14.1,0 h1.5
  text "B62" at 63.4,0 h1.5
Mechanical 2:
  lines w0.25: -16.5,0.3 cw(c-16.5,-0.7) -15.5,-0.7 -15.5,-6.5 ; 64.7,0.3 ccw(c64.7,-0.7) 63.7,-0.7 63.7,-6.5 ; -15.5,-6.5 -1,-6.5 ; -15.5,-6.5 -14,-8 -2.5,-8 -1,-6.5 ; -1,-6.5 -1,0 cw(c0,0) 1,0 1,-6.5 ; 1,-6.5 47.2,-6.5 ; 1,-6.5 2.5,-8 45.7,-8 47.2,-6.5 ; 47.2,-6.5 47.2,0 cw(c48.2,0) 49.2,0 49.2,-6.5 ; 49.2,-6.5 63.7,-6.5 ; 49.2,-6.5 50.7,-8 62.2,-8 63.7,-6.5
  text "A52" at 49.6,0 h1.5
  text "A49" at 45.8,0 h1.5
  text "A14" at 1.4,0 h1.5
  text "A11" at -2.4,0 h1.5
  text "A1" at -15.1,0 h1.5
  text "A62" at 62.4,0 h1.5